# Altium footprint library Elettronica FM.PcbLib: 387 footprints (part 18 of 25)
Each footprint in its own frame and in the unit in brackets; x right, y up, seen from the top. Pads: shape width x height; smd on the part's side, far side on the other; paste and mask are expansions set on the pad; w line width, h text height; cw(c..) or ccw(c..) is an arc to the next point about the centre after c.
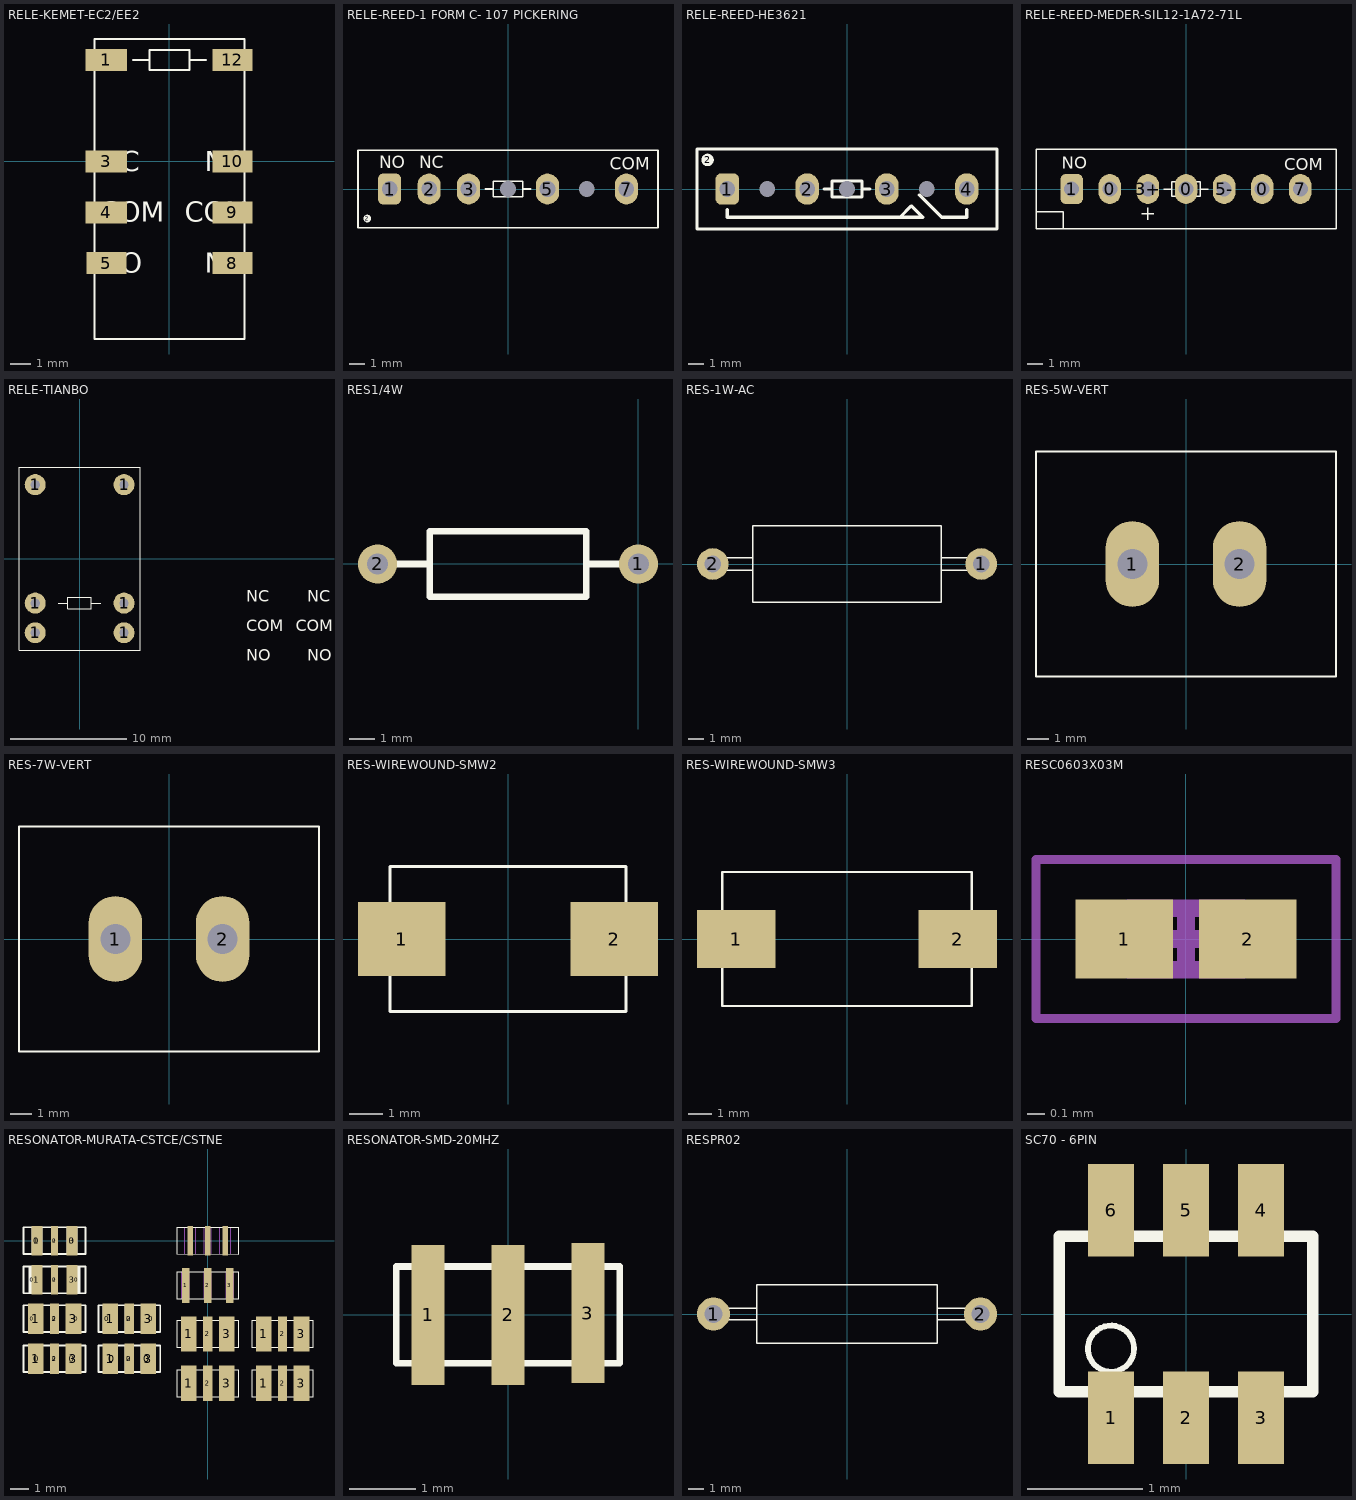
[diagram p17: the footprints below, top view; thin cyan lines are the x and y axes]

## RELE-KEMET-EC2/EE2 [mm]
pads (8):
  rect 2.06x1.1 smd: 1(-3.15,5.08) 3(-3.15,0) 4(-3.15,-2.54)
  rect 2x1.1 smd: 5(-3.15,-5.08) 8(3.15,-5.08) 9(3.15,-2.54) 10(3.15,0) 12(3.15,5.08)
Top Overlay:
  lines w0.1: -1.825,5.075 -1,5.075 ; 1,5.075 1.825,5.075 ; -3.75,-8.875 3.75,-8.875 3.75,6.125 -3.75,6.125 -3.75,-8.875 ; -1,4.575 1,4.575 1,5.575 -1,5.575 -1,4.575
  text "NC" at -3.45,-0.5 h1
  text "COM" at -3.45,-3.025 h1
  text "NO" at -3.45,-5.575 h1
  text "NO" at 1.775,-5.575 h1
  text "COM" at 0.775,-3.025 h1
  text "NC" at 1.775,-0.5 h1
3D body: height 10, standoff 1, extent -3.75,-8.875 3.75,6.125

## RELE-REED-1 FORM C- 107 PICKERING [mm]
height 1.9
pads (8):
  round 0 hole 1 mask+0.1: 0(0,0) 0(5.08,0)
  rrect50% 1.5x2 hole 1 mask+0.1: 1(-7.62,0)
  round 0.5 on Top Overlay mask+0.1: 2(-9.05,-1.9)
  oval 1.5x2 hole 1 mask+0.1: 2(-5.08,0) 3(-2.54,0) 5(2.54,0) 7(7.62,0)
Top Overlay:
  lines w0.1: -1.475,0 -0.95,0 ; 1.475,0 0.95,0 ; -0.95,0 -0.95,0.5 0.95,0.5 0.95,0 ; -0.95,0 -0.95,-0.5 0.95,-0.5 0.95,0 ; -9.65,-2.5 9.65,-2.5 9.65,2.5 -9.65,2.5 -9.65,-2.5
  text "COM" at 6.55,1.25 h0.8
  text "NC" at -5.725,1.35 h0.8
  text "NO" at -8.275,1.35 h0.8
3D body: height 7.62, standoff 0, extent -9.65,-2.5 9.65,2.5

## RELE-REED-HE3621 [mm]
height 1.9
pads (8):
  round 0 hole 1 unplated mask+0.1: 0(-5.08,0) 0(0,0) 0(5.08,0)
  rrect50% 1.5x2 hole 1 mask+0.1: 1(-7.62,0)
  round 0.8 on Top Overlay mask+0.1: 2(-8.875,1.85)
  oval 1.5x2 hole 1 mask+0.1: 2(-2.54,0) 3(2.54,0) 4(7.62,0)
Top Overlay:
  lines w0.2: -7.625,-1.3 -7.625,-1.8 3.375,-1.8 ; -1.475,0 -0.95,0 ; 1.475,0 0.95,0 ; 4.6,-0.375 6.025,-1.8 7.625,-1.8 7.625,-1.3 ; -0.95,0 -0.95,0.5 0.95,0.5 0.95,0 ; -0.95,0 -0.95,-0.5 0.95,-0.5 0.95,0 ; 3.375,-1.8 4.1,-1.075 4.825,-1.8 3.375,-1.8 ; -9.55,-2.54 9.55,-2.54 9.55,2.54 -9.55,2.54 -9.55,-2.54
3D body: height 7.62, standoff 0, extent -9.55,-2.55 9.55,2.55

## RELE-REED-MEDER-SIL12-1A72-71L [mm]
height 1.9
pads (7):
  oval 1.5x2 hole 1 mask+0.1: 0(-5.08,0) 0(0,0) 0(5.08,0) 3+(-2.54,0) 5-(2.54,0) 7(7.62,0)
  rrect50% 1.5x2 hole 1 mask+0.1: 1(-7.62,0)
Top Overlay:
  lines w0.1: -10,-1.525 -8.175,-1.525 -8.175,-2.65 ; -2.95,-1.65 -2.15,-1.65 ; -2.55,-2.05 -2.55,-1.25 ; -1.475,0 -0.95,0 ; 1.475,0 0.95,0 ; -0.95,0 -0.95,0.5 0.95,0.5 0.95,0 ; -0.95,0 -0.95,-0.5 0.95,-0.5 0.95,0 ; -10,-2.65 10,-2.65 10,2.65 -10,2.65 -10,-2.65
  text "COM" at 6.55,1.25 h0.8
  text "NO" at -8.275,1.35 h0.8
3D body: height 8, standoff 0, extent -10,-2.65 10,2.65

## RELE-TIANBO [mm]
pads (6):
  round 1.8 hole 0.8: 1(-3.81,-6.35) 1(-3.81,-3.81) 1(-3.81,6.35) 1(3.81,-6.35) 1(3.81,-3.81) 1(3.81,6.35)
Top Overlay:
  lines w0.1: -1.825,-3.81 -1,-3.81 ; 1,-3.81 1.825,-3.81 ; -5.2,-7.85 -5.2,7.85 5.2,7.85 5.2,-7.85 -5.2,-7.85 ; -1,-4.31 -1,-3.31 1,-3.31 1,-4.31 -1,-4.31
  text "NC" at 19.525,-3.685 h1
  text "COM" at 18.525,-6.21 h1
  text "NO" at 19.525,-8.76 h1
  text "NO" at 14.3,-8.76 h1
  text "COM" at 14.3,-6.21 h1
  text "NC" at 14.3,-3.685 h1

## RES1/4W [mil]
height 334.65
pads (2):
  round 60 hole 32: 1(0,0) 2(-400,0)
Top Overlay:
  lines w10: -400,0 -325,0 ; -75,0 0,0 ; -320,-50 -320,50 -80,50 -80,-50 -320,-50

## RES-1W-AC [mm]
height 8.5
pads (2):
  round 2.1 hole 1.1: 1(8.9,0) 2(-8.9,0)
Top Overlay:
  lines w0.1: -6.25,-0.4 -8.9,-0.4 cw(c-8.9,0) -8.9,0.4 -6.25,0.4 ; 6.25,-0.4 8.9,-0.4 ccw(c8.9,0) 8.9,0.4 6.25,0.4 ; -6.25,-2.55 6.25,-2.55 6.25,2.55 -6.25,2.55 -6.25,-2.55

## RES-5W-VERT [mm]
pads (2):
  oval 2.5x4 hole 1.4: 1(-2.5,0) 2(2.5,0)
Top Overlay:
  lines w0.1: -7,-5.25 7,-5.25 7,5.25 -7,5.25 -7,-5.25
3D body: height 26, standoff 0, extent -7,-5.25 7,5.25
3D body: height 0, standoff -4.5, extent 2.078,-0.424 2.925,0.424
3D body: height 0, standoff -4.5, extent -2.922,-0.424 -2.075,0.424

## RES-7W-VERT [mm]
pads (2):
  oval 2.5x4 hole 1.4: 1(-2.5,0) 2(2.5,0)
Top Overlay:
  lines w0.1: -7,-5.25 -7,5.25 7,5.25 7,-5.25 -7,-5.25
3D body: height 0, standoff -4.5, extent -2.922,-0.424 -2.075,0.424
3D body: height 0, standoff -4.5, extent 2.078,-0.424 2.925,0.424
3D body: height 40, standoff 0, extent -7,-5.25 7,5.25

## RES-WIREWOUND-SMW2 [mm]
height 1.9
pads (2):
  rect 2.6x2.2 smd mask+0.1: 1(-3.15,0) 2(3.15,0)
Top Overlay:
  lines w0.1: -3.275,-0.85 -3.5,-0.85 ; -3.275,0.85 -3.5,0.85 ; -3.075,-0.85 -2.85,-0.85 ; -3.075,0.85 -2.85,0.85 ; -2.625,-0.85 -2.4,-0.85 ; -2.625,0.85 -2.4,0.85 ; -2.15,-0.85 -2.15,-0.625 ; -2.15,-0.325 -2.15,-0.1 ; -2.15,0.15 -2.15,0.375 ; -2.15,0.625 -2.15,0.85 ; 2.15,-0.85 2.15,-0.625 ; 2.15,-0.325 2.15,-0.1 ; 2.15,0.15 2.15,0.375 ; 2.15,0.625 2.15,0.85 ; 2.4,-0.85 2.625,-0.85 ; 2.4,0.85 2.625,0.85 ; 2.85,-0.85 3.075,-0.85 ; 2.85,0.85 3.075,0.85 ; 3.275,-0.85 3.5,-0.85 3.95,-0.85 3.95,0.85 3.5,0.85 3.275,0.85 ; -3.5,-0.85 -3.95,-0.85 -3.95,0.85 -3.5,0.85 ; -3.5,-0.85 -3.5,-2.15 3.5,-2.15 3.5,2.15 -3.5,2.15 -3.5,0.85 ; -3.5,-0.85 -3.5,0.85
3D body: height 3.85, standoff 0, extent -3.5,-2.15 3.5,2.15

## RES-WIREWOUND-SMW3 [mm]
height 1.9
pads (2):
  rect 3.4x2.5 smd mask+0.1: 1(-4.8,0) 2(4.8,0)
Top Overlay:
  lines w0.1: -5.175,-1 -5.4,-1 -6,-1 -6,1 -5.4,1 -5.175,1 ; -4.975,-1 -4.75,-1 ; -4.975,1 -4.75,1 ; -4.525,-1 -4.3,-1 ; -4.525,1 -4.3,1 ; -4.075,-1 -3.85,-1 ; -4.075,1 -3.85,1 ; -3.625,-1 -3.4,-1 ; -3.625,1 -3.4,1 ; -3.4,-0.8 -3.4,-0.575 ; -3.4,-0.325 -3.4,-0.1 ; -3.4,0.15 -3.4,0.375 ; -3.4,0.625 -3.4,0.85 ; 3.4,-1 3.625,-1 ; 3.4,-0.8 3.4,-0.575 ; 3.4,-0.325 3.4,-0.1 ; 3.4,0.15 3.4,0.375 ; 3.4,0.625 3.4,0.85 ; 3.4,1 3.625,1 ; 3.85,-1 4.075,-1 ; 3.85,1 4.075,1 ; 4.3,-1 4.525,-1 ; 4.3,1 4.525,1 ; 4.75,-1 4.975,-1 ; 4.75,1 4.975,1 ; 5.175,-1 5.4,-1 6,-1 6,1 5.4,1 5.175,1 ; -5.4,-2.9 5.4,-2.9 5.4,2.9 -5.4,2.9 -5.4,-2.9
3D body: height 5.3, standoff 0, extent -5.4,-2.9 5.4,2.9

## RESC0603X03M [mm] "Chip Resistor, 2-Leads, Body 0,60x0,30mm, IPC Low Density"
height 0.3
pads (2):
  rect 0.55x0.45 smd: 1(-0.35,0) 2(0.35,0)
Mechanical 13:
  lines w0.1: -0.325,-0.175 0.325,-0.175 0.325,0.175 -0.325,0.175 -0.325,-0.175
Mechanical 15:
  lines w0.05: -0.85,-0.45 0.85,-0.45 0.85,0.45 -0.85,0.45 -0.85,-0.45
  lines w0.1: -0.175,0 0.175,0 ; 0,-0.175 0,0.175
3D body: height 0.3, standoff 0, extent 0.175,-0.175 0.325,0.175
3D body: height 0.3, standoff 0, extent -0.325,-0.175 -0.175,0.175
3D body: height 0.3, standoff 0, extent -0.175,-0.175 0.175,0.175

## RESONATOR-MURATA-CSTCE/CSTNE [mm]
height 16.6
pads (54):
  rect 0.4x1.45 on Top Overlay paste+0 mask+0.05: 0(-9.5,-4.225) 0(-9.5,-2.125) 0(-8.3,-6.4) 0(-8.3,-4.225) 0(-8.3,-2.125) 0(-8.3,0) 0(-7.1,-4.225) 0(-7.1,-2.125)
  rect 0.6x1.45 on Top Overlay paste+0 mask+0.05: 0(-9.25,-6.4) 0(-9.25,0) 0(-7.35,-6.4) 0(-7.35,0)
  rect 0.5x1.45 on Top Overlay paste+0 mask+0.05: 0(-5.45,-4.225) 0(-4.25,-6.4) 0(-4.25,-4.225) 0(-3.05,-4.225)
  rect 0.7x1.45 on Top Overlay paste+0 mask+0.05: 0(-5.2,-6.4) 0(-3.3,-6.4)
  rect 0.85x1.65 smd mask+0.1: 1(-9.325,-6.4) 1(-9.325,-4.225) 3(-7.275,-6.4) 3(-7.275,-4.225)
  rect 0.6x1.6 smd mask+0.1: 1(-9.25,-2.125) 1(-9.25,0) 3(-7.35,-2.125) 3(-7.35,0)
  rect 0.85x1.65 smd paste-5 mask-5: 1(-5.275,-6.4) 1(-5.275,-4.225) 3(-3.225,-6.4) 3(-3.225,-4.225)
  rect 0.4x1.9 smd paste-0.05 mask+0.075: 1(-1.2,-2.425) 2(0,-2.425) 3(1.2,-2.425)
  rect 0.85x1.9 smd paste-0.05 mask+0.075: 1(-1.025,-7.725) 1(-1.025,-5.05) 3(1.025,-7.725) 3(1.025,-5.05)
  rect 0.3x1.6 smd paste-0.05 mask+0.075: 1(-0.95,0) 2(0,0) 3(0.95,0)
  rect 0.85x1.9 smd paste-5 mask-5: 1(3.025,-7.725) 1(3.025,-5.05) 3(5.075,-7.725) 3(5.075,-5.05)
  rect 0.5x1.65 smd mask+0.1: 2(-8.3,-6.4) 2(-8.3,-4.225)
  rect 0.4x1.6 smd mask+0.1: 2(-8.3,-2.125) 2(-8.3,0)
  rect 0.5x1.65 smd paste-0.05 mask+0.075: 2(-4.25,-6.4) 2(-4.25,-4.225)
  rect 0.5x1.9 smd paste-0.05 mask+0.075: 2(0,-7.725) 2(0,-5.05) 2(4.05,-7.725) 2(4.05,-5.05)
Top Overlay:
  lines w0.01: -1.675,-8.45 -1.675,-7 1.675,-7 1.675,-8.45 -1.675,-8.45 ; -1.675,-5.775 1.675,-5.775 1.675,-4.325 -1.675,-4.325 -1.675,-5.775 ; -1.675,-3.15 -1.675,-1.7 1.675,-1.7 1.675,-3.15 -1.675,-3.15 ; -1.675,-0.725 1.675,-0.725 1.675,0.725 -1.675,0.725 -1.675,-0.725 ; 2.375,-8.45 5.725,-8.45 5.725,-7 2.375,-7 2.375,-8.45 ; 2.375,-5.775 2.375,-4.325 5.725,-4.325 5.725,-5.775 2.375,-5.775
  lines w0.1: -9.975,-7.125 -6.625,-7.125 -6.625,-5.675 -9.975,-5.675 -9.975,-7.125 ; -9.975,-4.95 -9.975,-3.5 -6.625,-3.5 -6.625,-4.95 -9.975,-4.95 ; -9.975,-2.85 -6.625,-2.85 -6.625,-1.4 -9.975,-1.4 -9.975,-2.85 ; -9.975,-0.725 -9.975,0.725 -6.625,0.725 -6.625,-0.725 -9.975,-0.725 ; -5.925,-7.125 -5.925,-5.675 -2.575,-5.675 -2.575,-7.125 -5.925,-7.125 ; -5.925,-4.95 -2.575,-4.95 -2.575,-3.5 -5.925,-3.5 -5.925,-4.95
Top Paste:
  region: -5.1,-5.625 -4.9,-5.625 -4.9,-7.175 -5.1,-7.175
  region: -2.85,-3.45 -3.25,-3.45 -3.25,-5 -2.85,-5
  region: -5.65,-3.45 -5.25,-3.45 -5.25,-5 -5.65,-5
  region: -5.65,-5.625 -5.25,-5.625 -5.25,-7.175 -5.65,-7.175
  region: -2.85,-5.625 -3.25,-5.625 -3.25,-7.175 -2.85,-7.175
  region: -3.4,-5.625 -3.6,-5.625 -3.6,-7.175 -3.4,-7.175
  region: 4.9,-6.825 4.7,-6.825 4.7,-8.625 4.9,-8.625
  region: 5.45,-6.825 5.05,-6.825 5.05,-8.625 5.45,-8.625
  region: 2.65,-6.825 3.05,-6.825 3.05,-8.625 2.65,-8.625
  region: 2.65,-4.15 3.05,-4.15 3.05,-5.95 2.65,-5.95
  region: 5.45,-4.15 5.05,-4.15 5.05,-5.95 5.45,-5.95
  region: 3.2,-6.825 3.4,-6.825 3.4,-8.625 3.2,-8.625
Top Solder:
  region: 2.525,-6.7 2.525,-8.75 3.1,-8.75 3.1,-6.7
  region: 3.2,-6.7 3.2,-8.75 3.525,-8.75 3.525,-6.7
  region: 4.9,-6.7 4.9,-8.75 4.575,-8.75 4.575,-6.7
  region: 5.575,-6.7 5.575,-8.75 5,-8.75 5,-6.7
  region: -2.725,-5.5 -2.725,-7.3 -3.3,-7.3 -3.3,-5.5
  region: -3.4,-5.5 -3.4,-7.3 -3.725,-7.3 -3.725,-5.5
  region: -5.1,-5.5 -5.1,-7.3 -4.775,-7.3 -4.775,-5.5
  region: -5.775,-5.5 -5.775,-7.3 -5.2,-7.3 -5.2,-5.5
  region: -5.775,-3.325 -5.775,-5.125 -5.2,-5.125 -5.2,-3.325
  region: -5.1,-3.325 -5.1,-5.125 -4.775,-5.125 -4.775,-3.325
  region: -3.4,-3.325 -3.4,-5.125 -3.725,-5.125 -3.725,-3.325
  region: -2.725,-3.325 -2.725,-5.125 -3.3,-5.125 -3.3,-3.325
  region: 5.575,-4.025 5.575,-6.075 5,-6.075 5,-4.025
  region: 4.9,-4.025 4.9,-6.075 4.575,-6.075 4.575,-4.025
  region: 3.2,-4.025 3.2,-6.075 3.525,-6.075 3.525,-4.025
  region: 2.525,-4.025 2.525,-6.075 3.1,-6.075 3.1,-4.025
Mechanical 27:
  lines w0.01: -1.4,-5.775 -1.4,-4.325 ; -1.4,-3.15 -1.4,-1.7 ; -1.25,-8.45 -1.25,-7 ; -1.25,-0.725 -1.25,0.725 ; -1,-5.775 -1,-4.325 ; -1,-3.15 -1,-1.7 ; -0.65,-8.45 -0.65,-7 ; -0.65,-0.725 -0.65,0.725 ; -0.2,-8.45 -0.2,-7 ; -0.2,-5.775 -0.2,-4.325 ; -0.2,-3.15 -0.2,-1.7 ; -0.2,-0.725 -0.2,0.725 ; 0.2,-8.45 0.2,-7 ; 0.2,-5.775 0.2,-4.325 ; 0.2,-3.15 0.2,-1.7 ; 0.2,-0.725 0.2,0.725 ; 0.65,-8.45 0.65,-7 ; 0.65,-0.725 0.65,0.725 ; 1,-5.775 1,-4.325 ; 1,-3.15 1,-1.7 ; 1.25,-8.45 1.25,-7 ; 1.25,-0.725 1.25,0.725 ; 1.4,-5.775 1.4,-4.325 ; 1.4,-3.15 1.4,-1.7 ; 2.65,-5.775 2.65,-4.325 ; 2.8,-8.45 2.8,-7 ; 3.05,-5.775 3.05,-4.325 ; 3.4,-8.45 3.4,-7 ; 3.85,-8.45 3.85,-7 ; 3.85,-5.775 3.85,-4.325 ; 4.25,-8.45 4.25,-7 ; 4.25,-5.775 4.25,-4.325 ; 4.7,-8.45 4.7,-7 ; 5.05,-5.775 5.05,-4.325 ; 5.3,-8.45 5.3,-7 ; 5.45,-5.775 5.45,-4.325

## RESONATOR-SMD-20MHZ [mm]
height 16.6
pads (3):
  rect 0.5x2.1 smd mask+0.1: 1(-1.2,0) 2(0,0) 3(1.2,0.025)
Top Overlay:
  lines w0.1: -1.675,-0.725 -1.675,0.725 1.675,0.725 1.675,-0.725 -1.675,-0.725
3D body: height 1, standoff 0, extent -1.65,-1.3 1.65,1.3

## RESPR02 [mm]
pads (2):
  round 2.2 hole 1.2: 1(-8.9,0) 2(8.9,0)
Top Overlay:
  lines w0.1: -6,-0.4 -8.9,-0.4 cw(c-8.9,0) -8.9,0.4 -6,0.4 ; 6,-0.4 8.9,-0.4 ccw(c8.9,0) 8.9,0.4 6,0.4 ; -6,-1.95 -6,1.95 6,1.95 6,-1.95 -6,-1.95

## SC70 - 6PIN [mm]
pads (6):
  rect 0.4x0.8 smd: 1(-0.65,-0.9) 2(0,-0.9) 3(0.65,-0.9) 4(0.65,0.9) 5(0,0.9) 6(-0.65,0.9)
Top Overlay:
  circle w0.05: c-0.65,-0.3 r0.2
  lines w0.1: -1.1,-0.675 1.1,-0.675 1.1,0.675 -1.1,0.675 -1.1,-0.675
3D body: height 1.1, standoff 0, extent -1.1,-0.675 1.1,0.675